# Altium footprint library con-samtec.PCBLIB: 805 footprints (part 38 of 55)
Each footprint in its own frame and in the unit in brackets; x right, y up, seen from the top. Pads: shape width x height; smd on the part's side, far side on the other; paste and mask are expansions set on the pad; w line width, h text height; cw(c..) or ccw(c..) is an arc to the next point about the centre after c.
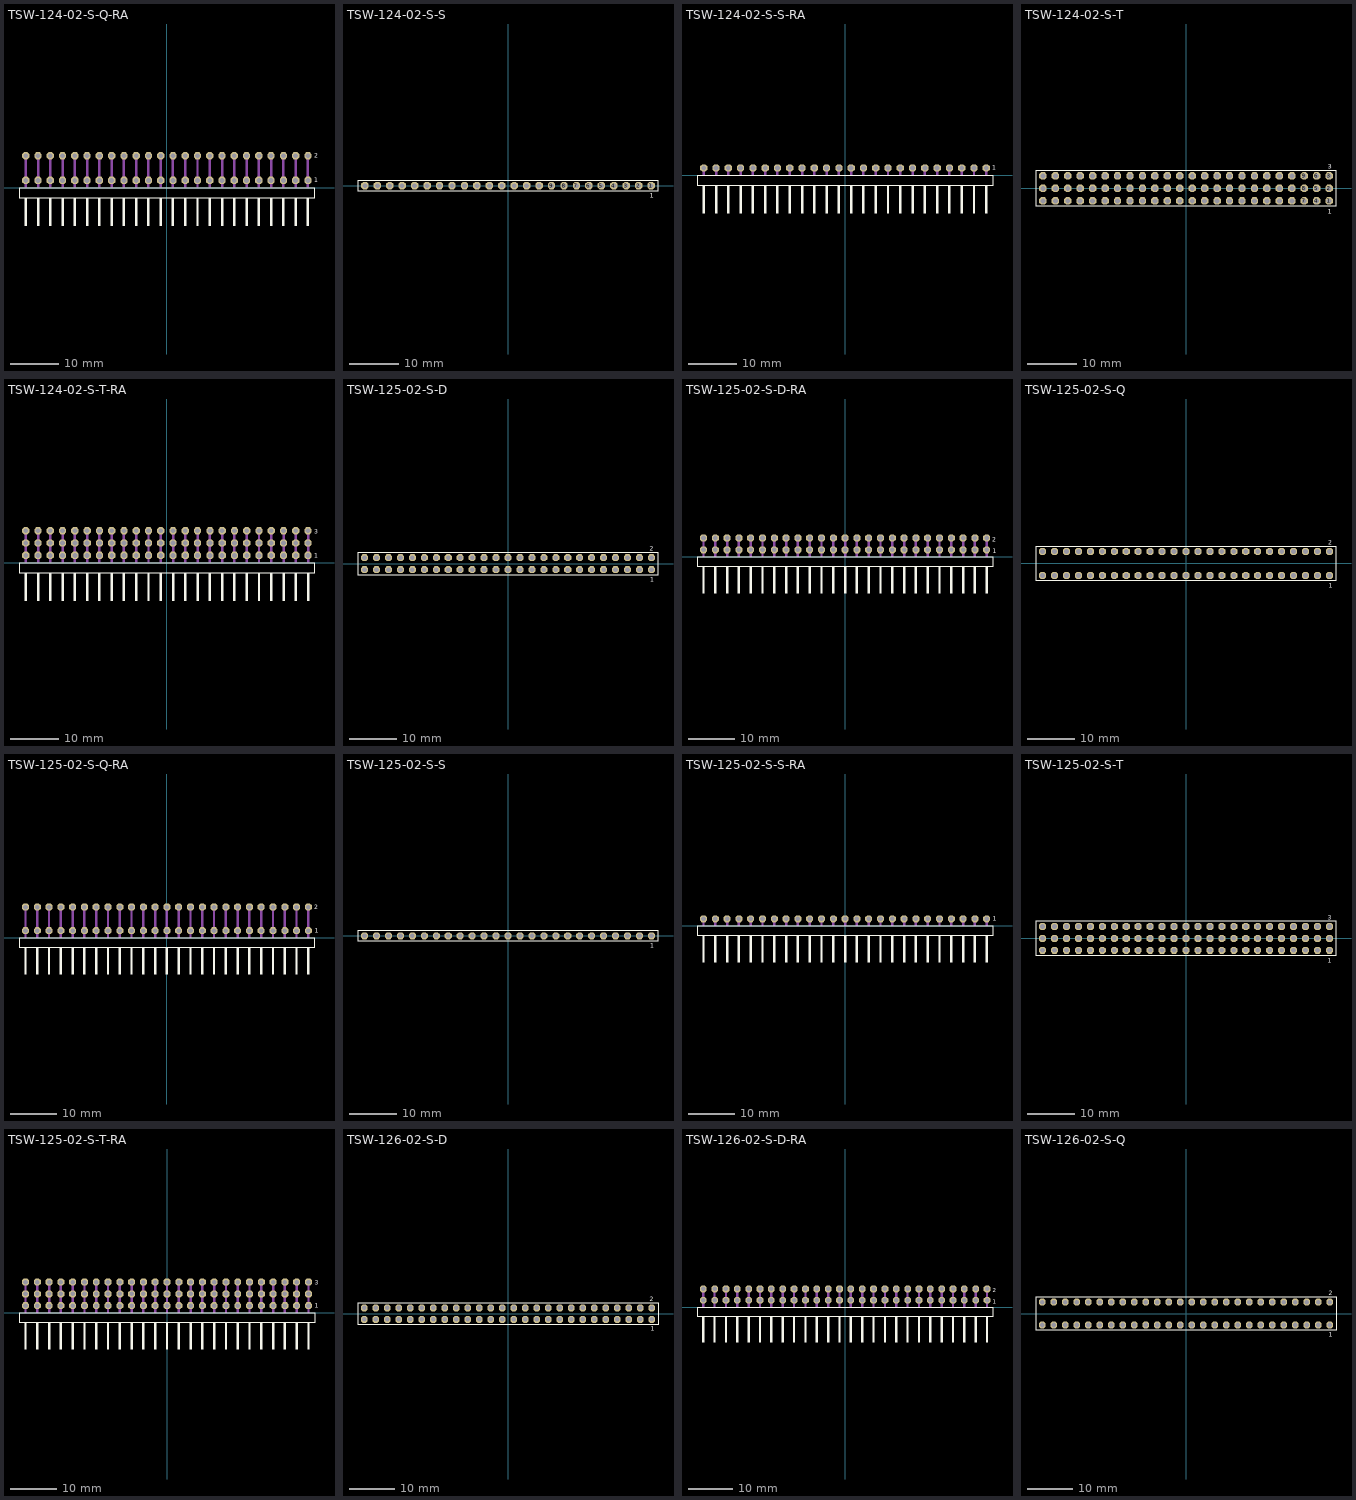
[diagram p37: the footprints below, top view; thin cyan lines are the x and y axes]

## TSW-124-02-S-Q-RA [mil]
pads (48):
  oct 59.06x59.06 hole 39.37: 1(1150,60) 2(1150,260) 3(1050,60) 4(1050,260) 5(950,60) 6(950,260) 7(850,60) 8(850,260) 9(750,60) 10(750,260) 11(650,60) 12(650,260) 13(550,60) 14(550,260) 15(450,60) 16(450,260) 17(350,60) 18(350,260) 19(250,60) 20(250,260) 21(150,60) 22(150,260) 23(50,60) 24(50,260) 25(-50,60) 26(-50,260) 27(-150,60) 28(-150,260) 29(-250,60) 30(-250,260) 31(-350,60) 32(-350,260) 33(-450,60) 34(-450,260) 35(-550,60) 36(-550,260) 37(-650,60) 38(-650,260) 39(-750,60) 40(-750,260) 41(-850,60) 42(-850,260) 43(-950,60) 44(-950,260) 45(-1050,60) 46(-1050,260) 47(-1150,60) 48(-1150,260)
Top Overlay:
  rectangle: -1160,-310.63 -1140,-80.32
  rectangle: -1060,-310.63 -1040,-80.32
  rectangle: -960,-310.63 -940,-80.32
  rectangle: -860,-310.63 -840,-80.32
  rectangle: -760,-310.63 -740,-80.32
  rectangle: -660,-310.63 -640,-80.32
  rectangle: -560,-310.63 -540,-80.32
  rectangle: -460,-310.63 -440,-80.32
  rectangle: -360,-310.63 -340,-80.32
  rectangle: -260,-310.63 -240,-80.32
  rectangle: -160,-310.63 -140,-80.32
  rectangle: -60,-310.63 -40,-80.32
  rectangle: 40,-310.63 60,-80.32
  rectangle: 140,-310.63 160,-80.32
  rectangle: 240,-310.63 260,-80.32
  rectangle: 340,-310.63 360,-80.32
  rectangle: 440,-310.63 460,-80.32
  rectangle: 540,-310.63 560,-80.32
  rectangle: 640,-310.63 660,-80.32
  rectangle: 740,-310.63 760,-80.32
  rectangle: 840,-310.63 860,-80.32
  rectangle: 940,-310.63 960,-80.32
  rectangle: 1040,-310.63 1060,-80.32
  rectangle: 1140,-310.63 1160,-80.32
  lines w8: -1205.08,-80.55 1205.08,-80.55 1205.08,-4.17 -1205.08,-4.17 -1205.08,-80.55
  text "1" at 1203.54,43.31 h36.81
  text "2" at 1201.18,242.72 h36.81
Mechanical 16:
  rectangle: -1160,0 -1140,270
  rectangle: -1060,0 -1040,270
  rectangle: -960,0 -940,270
  rectangle: -860,0 -840,270
  rectangle: -760,0 -740,270
  rectangle: -660,0 -640,270
  rectangle: -560,0 -540,270
  rectangle: -460,0 -440,270
  rectangle: -360,0 -340,270
  rectangle: -260,0 -240,270
  rectangle: -160,0 -140,270
  rectangle: -60,0 -40,270
  rectangle: 40,0 60,270
  rectangle: 140,0 160,270
  rectangle: 240,0 260,270
  rectangle: 340,0 360,270
  rectangle: 440,0 460,270
  rectangle: 540,0 560,270
  rectangle: 640,0 660,270
  rectangle: 740,0 760,270
  rectangle: 840,0 860,270
  rectangle: 940,0 960,270
  rectangle: 1040,0 1060,270
  rectangle: 1140,0 1160,270

## TSW-124-02-S-S [mm]
pads (24):
  oct 1.5x1.5 hole 1: 1(29.21,0) 2(26.67,0) 3(24.13,0) 4(21.59,0) 5(19.05,0) 6(16.51,0) 7(13.97,0) 8(11.43,0) 9(8.89,0) 10(6.35,0) 11(3.81,0) 12(1.27,0) 13(-1.27,0) 14(-3.81,0) 15(-6.35,0) 16(-8.89,0) 17(-11.43,0) 18(-13.97,0) 19(-16.51,0) 20(-19.05,0) 21(-21.59,0) 22(-24.13,0) 23(-26.67,0) 24(-29.21,0)
Top Overlay:
  lines w0.203: -30.609,-1.155 30.609,-1.155 30.609,1.155 -30.609,1.155 -30.609,-1.155
  text "1" at 28.952,-2.498 h0.94
Mechanical 16:
  rectangle: -29.56,-0.35 -28.86,0.35
  rectangle: -27.02,-0.35 -26.32,0.35
  rectangle: -24.48,-0.35 -23.78,0.35
  rectangle: -21.94,-0.35 -21.24,0.35
  rectangle: -19.4,-0.35 -18.7,0.35
  rectangle: -16.86,-0.35 -16.16,0.35
  rectangle: -14.32,-0.35 -13.62,0.35
  rectangle: -11.78,-0.35 -11.08,0.35
  rectangle: -9.24,-0.35 -8.54,0.35
  rectangle: -6.7,-0.35 -6,0.35
  rectangle: -4.16,-0.35 -3.46,0.35
  rectangle: -1.62,-0.35 -0.92,0.35
  rectangle: 0.92,-0.35 1.62,0.35
  rectangle: 3.46,-0.35 4.16,0.35
  rectangle: 6,-0.35 6.7,0.35
  rectangle: 8.54,-0.35 9.24,0.35
  rectangle: 11.08,-0.35 11.78,0.35
  rectangle: 13.62,-0.35 14.32,0.35
  rectangle: 16.16,-0.35 16.86,0.35
  rectangle: 18.7,-0.35 19.4,0.35
  rectangle: 21.24,-0.35 21.94,0.35
  rectangle: 23.78,-0.35 24.48,0.35
  rectangle: 26.32,-0.35 27.02,0.35
  rectangle: 28.86,-0.35 29.56,0.35

## TSW-124-02-S-S-RA [mil]
pads (24):
  oct 59.06x59.06 hole 39.37: 1(1150,60) 2(1050,60) 3(950,60) 4(850,60) 5(750,60) 6(650,60) 7(550,60) 8(450,60) 9(350,60) 10(250,60) 11(150,60) 12(50,60) 13(-50,60) 14(-150,60) 15(-250,60) 16(-350,60) 17(-450,60) 18(-550,60) 19(-650,60) 20(-750,60) 21(-850,60) 22(-950,60) 23(-1050,60) 24(-1150,60)
Top Overlay:
  rectangle: -1160,-310.63 -1140,-80.32
  rectangle: -1060,-310.63 -1040,-80.32
  rectangle: -960,-310.63 -940,-80.32
  rectangle: -860,-310.63 -840,-80.32
  rectangle: -760,-310.63 -740,-80.32
  rectangle: -660,-310.63 -640,-80.32
  rectangle: -560,-310.63 -540,-80.32
  rectangle: -460,-310.63 -440,-80.32
  rectangle: -360,-310.63 -340,-80.32
  rectangle: -260,-310.63 -240,-80.32
  rectangle: -160,-310.63 -140,-80.32
  rectangle: -60,-310.63 -40,-80.32
  rectangle: 40,-310.63 60,-80.32
  rectangle: 140,-310.63 160,-80.32
  rectangle: 240,-310.63 260,-80.32
  rectangle: 340,-310.63 360,-80.32
  rectangle: 440,-310.63 460,-80.32
  rectangle: 540,-310.63 560,-80.32
  rectangle: 640,-310.63 660,-80.32
  rectangle: 740,-310.63 760,-80.32
  rectangle: 840,-310.63 860,-80.32
  rectangle: 940,-310.63 960,-80.32
  rectangle: 1040,-310.63 1060,-80.32
  rectangle: 1140,-310.63 1160,-80.32
  lines w8: -1205.08,-80.55 1205.08,-80.55 1205.08,-4.17 -1205.08,-4.17 -1205.08,-80.55
  text "1" at 1200.47,45.35 h36.81
Mechanical 16:
  rectangle: -1160,0 -1140,70
  rectangle: -1060,0 -1040,70
  rectangle: -960,0 -940,70
  rectangle: -860,0 -840,70
  rectangle: -760,0 -740,70
  rectangle: -660,0 -640,70
  rectangle: -560,0 -540,70
  rectangle: -460,0 -440,70
  rectangle: -360,0 -340,70
  rectangle: -260,0 -240,70
  rectangle: -160,0 -140,70
  rectangle: -60,0 -40,70
  rectangle: 40,0 60,70
  rectangle: 140,0 160,70
  rectangle: 240,0 260,70
  rectangle: 340,0 360,70
  rectangle: 440,0 460,70
  rectangle: 540,0 560,70
  rectangle: 640,0 660,70
  rectangle: 740,0 760,70
  rectangle: 840,0 860,70
  rectangle: 940,0 960,70
  rectangle: 1040,0 1060,70
  rectangle: 1140,0 1160,70

## TSW-124-02-S-T [mm]
pads (72):
  oct 1.5x1.5 hole 1: 1(29.21,-2.54) 2(29.21,0) 3(29.21,2.54) 4(26.67,-2.54) 5(26.67,0) 6(26.67,2.54) 7(24.13,-2.54) 8(24.13,0) 9(24.13,2.54) 10(21.59,-2.54) 11(21.59,0) 12(21.59,2.54) 13(19.05,-2.54) 14(19.05,0) 15(19.05,2.54) 16(16.51,-2.54) 17(16.51,0) 18(16.51,2.54) 19(13.97,-2.54) 20(13.97,0) 21(13.97,2.54) 22(11.43,-2.54) 23(11.43,0) 24(11.43,2.54) 25(8.89,-2.54) 26(8.89,0) 27(8.89,2.54) 28(6.35,-2.54) 29(6.35,0) 30(6.35,2.54) 31(3.81,-2.54) 32(3.81,0) 33(3.81,2.54) 34(1.27,-2.54) 35(1.27,0) 36(1.27,2.54) 37(-1.27,-2.54) 38(-1.27,0) 39(-1.27,2.54) 40(-3.81,-2.54) 41(-3.81,0) 42(-3.81,2.54) 43(-6.35,-2.54) 44(-6.35,0) 45(-6.35,2.54) 46(-8.89,-2.54) 47(-8.89,0) 48(-8.89,2.54) 49(-11.43,-2.54) 50(-11.43,0) 51(-11.43,2.54) 52(-13.97,-2.54) 53(-13.97,0) 54(-13.97,2.54) 55(-16.51,-2.54) 56(-16.51,0) 57(-16.51,2.54) 58(-19.05,-2.54) 59(-19.05,0) 60(-19.05,2.54) 61(-21.59,-2.54) 62(-21.59,0) 63(-21.59,2.54) 64(-24.13,-2.54) 65(-24.13,0) 66(-24.13,2.54) 67(-26.67,-2.54) 68(-26.67,0) 69(-26.67,2.54) 70(-29.21,-2.54) 71(-29.21,0) 72(-29.21,2.54)
Top Overlay:
  lines w0.203: -30.609,-3.695 30.609,-3.695 30.609,3.695 -30.609,3.695 -30.609,-3.695
  text "1" at 28.902,-5.188 h0.94
  text "3" at 28.898,3.989 h0.94
Mechanical 16:
  rectangle: -29.56,-2.89 -28.86,-2.19
  rectangle: -29.56,-0.35 -28.86,0.35
  rectangle: -29.56,2.19 -28.86,2.89
  rectangle: -27.02,-2.89 -26.32,-2.19
  rectangle: -27.02,-0.35 -26.32,0.35
  rectangle: -27.02,2.19 -26.32,2.89
  rectangle: -24.48,-2.89 -23.78,-2.19
  rectangle: -24.48,-0.35 -23.78,0.35
  rectangle: -24.48,2.19 -23.78,2.89
  rectangle: -21.94,-2.89 -21.24,-2.19
  rectangle: -21.94,-0.35 -21.24,0.35
  rectangle: -21.94,2.19 -21.24,2.89
  rectangle: -19.4,-2.89 -18.7,-2.19
  rectangle: -19.4,-0.35 -18.7,0.35
  rectangle: -19.4,2.19 -18.7,2.89
  rectangle: -16.86,-2.89 -16.16,-2.19
  rectangle: -16.86,-0.35 -16.16,0.35
  rectangle: -16.86,2.19 -16.16,2.89
  rectangle: -14.32,-2.89 -13.62,-2.19
  rectangle: -14.32,-0.35 -13.62,0.35
  rectangle: -14.32,2.19 -13.62,2.89
  rectangle: -11.78,-2.89 -11.08,-2.19
  rectangle: -11.78,-0.35 -11.08,0.35
  rectangle: -11.78,2.19 -11.08,2.89
  rectangle: -9.24,-2.89 -8.54,-2.19
  rectangle: -9.24,-0.35 -8.54,0.35
  rectangle: -9.24,2.19 -8.54,2.89
  rectangle: -6.7,-2.89 -6,-2.19
  rectangle: -6.7,-0.35 -6,0.35
  rectangle: -6.7,2.19 -6,2.89
  rectangle: -4.16,-2.89 -3.46,-2.19
  rectangle: -4.16,-0.35 -3.46,0.35
  rectangle: -4.16,2.19 -3.46,2.89
  rectangle: -1.62,-2.89 -0.92,-2.19
  rectangle: -1.62,-0.35 -0.92,0.35
  rectangle: -1.62,2.19 -0.92,2.89
  rectangle: 0.92,-2.89 1.62,-2.19
  rectangle: 0.92,-0.35 1.62,0.35
  rectangle: 0.92,2.19 1.62,2.89
  rectangle: 3.46,-2.89 4.16,-2.19
  rectangle: 3.46,-0.35 4.16,0.35
  rectangle: 3.46,2.19 4.16,2.89
  rectangle: 6,-2.89 6.7,-2.19
  rectangle: 6,-0.35 6.7,0.35
  rectangle: 6,2.19 6.7,2.89
  rectangle: 8.54,-2.89 9.24,-2.19
  rectangle: 8.54,-0.35 9.24,0.35
  rectangle: 8.54,2.19 9.24,2.89
  rectangle: 11.08,-2.89 11.78,-2.19
  rectangle: 11.08,-0.35 11.78,0.35
  rectangle: 11.08,2.19 11.78,2.89
  rectangle: 13.62,-2.89 14.32,-2.19
  rectangle: 13.62,-0.35 14.32,0.35
  rectangle: 13.62,2.19 14.32,2.89
  rectangle: 16.16,-2.89 16.86,-2.19
  rectangle: 16.16,-0.35 16.86,0.35
  rectangle: 16.16,2.19 16.86,2.89
  rectangle: 18.7,-2.89 19.4,-2.19
  rectangle: 18.7,-0.35 19.4,0.35
  rectangle: 18.7,2.19 19.4,2.89
  rectangle: 21.24,-2.89 21.94,-2.19
  rectangle: 21.24,-0.35 21.94,0.35
  rectangle: 21.24,2.19 21.94,2.89
  rectangle: 23.78,-2.89 24.48,-2.19
  rectangle: 23.78,-0.35 24.48,0.35
  rectangle: 23.78,2.19 24.48,2.89
  rectangle: 26.32,-2.89 27.02,-2.19
  rectangle: 26.32,-0.35 27.02,0.35
  rectangle: 26.32,2.19 27.02,2.89
  rectangle: 28.86,-2.89 29.56,-2.19
  rectangle: 28.86,-0.35 29.56,0.35
  rectangle: 28.86,2.19 29.56,2.89

## TSW-124-02-S-T-RA [mil]
pads (72):
  oct 59.06x59.06 hole 39.37: 1(1150,60) 2(1150,160) 3(1150,260) 4(1050,60) 5(1050,160) 6(1050,260) 7(950,60) 8(950,160) 9(950,260) 10(850,60) 11(850,160) 12(850,260) 13(750,60) 14(750,160) 15(750,260) 16(650,60) 17(650,160) 18(650,260) 19(550,60) 20(550,160) 21(550,260) 22(450,60) 23(450,160) 24(450,260) 25(350,60) 26(350,160) 27(350,260) 28(250,60) 29(250,160) 30(250,260) 31(150,60) 32(150,160) 33(150,260) 34(50,60) 35(50,160) 36(50,260) 37(-50,60) 38(-50,160) 39(-50,260) 40(-150,60) 41(-150,160) 42(-150,260) 43(-250,60) 44(-250,160) 45(-250,260) 46(-350,60) 47(-350,160) 48(-350,260) 49(-450,60) 50(-450,160) 51(-450,260) 52(-550,60) 53(-550,160) 54(-550,260) 55(-650,60) 56(-650,160) 57(-650,260) 58(-750,60) 59(-750,160) 60(-750,260) 61(-850,60) 62(-850,160) 63(-850,260) 64(-950,60) 65(-950,160) 66(-950,260) 67(-1050,60) 68(-1050,160) 69(-1050,260) 70(-1150,60) 71(-1150,160) 72(-1150,260)
Top Overlay:
  rectangle: -1160,-310.63 -1140,-80.32
  rectangle: -1060,-310.63 -1040,-80.32
  rectangle: -960,-310.63 -940,-80.32
  rectangle: -860,-310.63 -840,-80.32
  rectangle: -760,-310.63 -740,-80.32
  rectangle: -660,-310.63 -640,-80.32
  rectangle: -560,-310.63 -540,-80.32
  rectangle: -460,-310.63 -440,-80.32
  rectangle: -360,-310.63 -340,-80.32
  rectangle: -260,-310.63 -240,-80.32
  rectangle: -160,-310.63 -140,-80.32
  rectangle: -60,-310.63 -40,-80.32
  rectangle: 40,-310.63 60,-80.32
  rectangle: 140,-310.63 160,-80.32
  rectangle: 240,-310.63 260,-80.32
  rectangle: 340,-310.63 360,-80.32
  rectangle: 440,-310.63 460,-80.32
  rectangle: 540,-310.63 560,-80.32
  rectangle: 640,-310.63 660,-80.32
  rectangle: 740,-310.63 760,-80.32
  rectangle: 840,-310.63 860,-80.32
  rectangle: 940,-310.63 960,-80.32
  rectangle: 1040,-310.63 1060,-80.32
  rectangle: 1140,-310.63 1160,-80.32
  lines w8: -1205.08,-80.55 1205.08,-80.55 1205.08,-4.17 -1205.08,-4.17 -1205.08,-80.55
  text "1" at 1201.57,41.34 h36.81
  text "3" at 1202.17,236.81 h36.81
Mechanical 16:
  rectangle: -1160,0 -1140,270
  rectangle: -1060,0 -1040,270
  rectangle: -960,0 -940,270
  rectangle: -860,0 -840,270
  rectangle: -760,0 -740,270
  rectangle: -660,0 -640,270
  rectangle: -560,0 -540,270
  rectangle: -460,0 -440,270
  rectangle: -360,0 -340,270
  rectangle: -260,0 -240,270
  rectangle: -160,0 -140,270
  rectangle: -60,0 -40,270
  rectangle: 40,0 60,270
  rectangle: 140,0 160,270
  rectangle: 240,0 260,270
  rectangle: 340,0 360,270
  rectangle: 440,0 460,270
  rectangle: 540,0 560,270
  rectangle: 640,0 660,270
  rectangle: 740,0 760,270
  rectangle: 840,0 860,270
  rectangle: 940,0 960,270
  rectangle: 1040,0 1060,270
  rectangle: 1140,0 1160,270

## TSW-125-02-S-D [mm]
pads (50):
  oct 1.5x1.5 hole 1: 1(30.48,-1.27) 2(30.48,1.27) 3(27.94,-1.27) 4(27.94,1.27) 5(25.4,-1.27) 6(25.4,1.27) 7(22.86,-1.27) 8(22.86,1.27) 9(20.32,-1.27) 10(20.32,1.27) 11(17.78,-1.27) 12(17.78,1.27) 13(15.24,-1.27) 14(15.24,1.27) 15(12.7,-1.27) 16(12.7,1.27) 17(10.16,-1.27) 18(10.16,1.27) 19(7.62,-1.27) 20(7.62,1.27) 21(5.08,-1.27) 22(5.08,1.27) 23(2.54,-1.27) 24(2.54,1.27) 25(0,-1.27) 26(0,1.27) 27(-2.54,-1.27) 28(-2.54,1.27) 29(-5.08,-1.27) 30(-5.08,1.27) 31(-7.62,-1.27) 32(-7.62,1.27) 33(-10.16,-1.27) 34(-10.16,1.27) 35(-12.7,-1.27) 36(-12.7,1.27) 37(-15.24,-1.27) 38(-15.24,1.27) 39(-17.78,-1.27) 40(-17.78,1.27) 41(-20.32,-1.27) 42(-20.32,1.27) 43(-22.86,-1.27) 44(-22.86,1.27) 45(-25.4,-1.27) 46(-25.4,1.27) 47(-27.94,-1.27) 48(-27.94,1.27) 49(-30.48,-1.27) 50(-30.48,1.27)
Top Overlay:
  lines w0.203: -31.879,-2.425 31.879,-2.425 31.879,2.425 -31.879,2.425 -31.879,-2.425
  text "1" at 30.272,-3.818 h0.94
  text "2" at 30.097,2.744 h0.94
Mechanical 16:
  rectangle: -30.83,-1.62 -30.13,-0.92
  rectangle: -30.83,0.92 -30.13,1.62
  rectangle: -28.29,-1.62 -27.59,-0.92
  rectangle: -28.29,0.92 -27.59,1.62
  rectangle: -25.75,-1.62 -25.05,-0.92
  rectangle: -25.75,0.92 -25.05,1.62
  rectangle: -23.21,-1.62 -22.51,-0.92
  rectangle: -23.21,0.92 -22.51,1.62
  rectangle: -20.67,-1.62 -19.97,-0.92
  rectangle: -20.67,0.92 -19.97,1.62
  rectangle: -18.13,-1.62 -17.43,-0.92
  rectangle: -18.13,0.92 -17.43,1.62
  rectangle: -15.59,-1.62 -14.89,-0.92
  rectangle: -15.59,0.92 -14.89,1.62
  rectangle: -13.05,-1.62 -12.35,-0.92
  rectangle: -13.05,0.92 -12.35,1.62
  rectangle: -10.51,-1.62 -9.81,-0.92
  rectangle: -10.51,0.92 -9.81,1.62
  rectangle: -7.97,-1.62 -7.27,-0.92
  rectangle: -7.97,0.92 -7.27,1.62
  rectangle: -5.43,-1.62 -4.73,-0.92
  rectangle: -5.43,0.92 -4.73,1.62
  rectangle: -2.89,-1.62 -2.19,-0.92
  rectangle: -2.89,0.92 -2.19,1.62
  rectangle: -0.35,-1.62 0.35,-0.92
  rectangle: -0.35,0.92 0.35,1.62
  rectangle: 2.19,-1.62 2.89,-0.92
  rectangle: 2.19,0.92 2.89,1.62
  rectangle: 4.73,-1.62 5.43,-0.92
  rectangle: 4.73,0.92 5.43,1.62
  rectangle: 7.27,-1.62 7.97,-0.92
  rectangle: 7.27,0.92 7.97,1.62
  rectangle: 9.81,-1.62 10.51,-0.92
  rectangle: 9.81,0.92 10.51,1.62
  rectangle: 12.35,-1.62 13.05,-0.92
  rectangle: 12.35,0.92 13.05,1.62
  rectangle: 14.89,-1.62 15.59,-0.92
  rectangle: 14.89,0.92 15.59,1.62
  rectangle: 17.43,-1.62 18.13,-0.92
  rectangle: 17.43,0.92 18.13,1.62
  rectangle: 19.97,-1.62 20.67,-0.92
  rectangle: 19.97,0.92 20.67,1.62
  rectangle: 22.51,-1.62 23.21,-0.92
  rectangle: 22.51,0.92 23.21,1.62
  rectangle: 25.05,-1.62 25.75,-0.92
  rectangle: 25.05,0.92 25.75,1.62
  rectangle: 27.59,-1.62 28.29,-0.92
  rectangle: 27.59,0.92 28.29,1.62
  rectangle: 30.13,-1.62 30.83,-0.92
  rectangle: 30.13,0.92 30.83,1.62

## TSW-125-02-S-D-RA [mil]
pads (50):
  oct 59.06x59.06 hole 39.37: 1(1200,60) 2(1200,160) 3(1100,60) 4(1100,160) 5(1000,60) 6(1000,160) 7(900,60) 8(900,160) 9(800,60) 10(800,160) 11(700,60) 12(700,160) 13(600,60) 14(600,160) 15(500,60) 16(500,160) 17(400,60) 18(400,160) 19(300,60) 20(300,160) 21(200,60) 22(200,160) 23(100,60) 24(100,160) 25(0,60) 26(0,160) 27(-100,60) 28(-100,160) 29(-200,60) 30(-200,160) 31(-300,60) 32(-300,160) 33(-400,60) 34(-400,160) 35(-500,60) 36(-500,160) 37(-600,60) 38(-600,160) 39(-700,60) 40(-700,160) 41(-800,60) 42(-800,160) 43(-900,60) 44(-900,160) 45(-1000,60) 46(-1000,160) 47(-1100,60) 48(-1100,160) 49(-1200,60) 50(-1200,160)
Top Overlay:
  rectangle: -1210,-310.63 -1190,-80.32
  rectangle: -1110,-310.63 -1090,-80.32
  rectangle: -1010,-310.63 -990,-80.32
  rectangle: -910,-310.63 -890,-80.32
  rectangle: -810,-310.63 -790,-80.32
  rectangle: -710,-310.63 -690,-80.32
  rectangle: -610,-310.63 -590,-80.32
  rectangle: -510,-310.63 -490,-80.32
  rectangle: -410,-310.63 -390,-80.32
  rectangle: -310,-310.63 -290,-80.32
  rectangle: -210,-310.63 -190,-80.32
  rectangle: -110,-310.63 -90,-80.32
  rectangle: -10,-310.63 10,-80.32
  rectangle: 90,-310.63 110,-80.32
  rectangle: 190,-310.63 210,-80.32
  rectangle: 290,-310.63 310,-80.32
  rectangle: 390,-310.63 410,-80.32
  rectangle: 490,-310.63 510,-80.32
  rectangle: 590,-310.63 610,-80.32
  rectangle: 690,-310.63 710,-80.32
  rectangle: 790,-310.63 810,-80.32
  rectangle: 890,-310.63 910,-80.32
  rectangle: 990,-310.63 1010,-80.32
  rectangle: 1090,-310.63 1110,-80.32
  rectangle: 1190,-310.63 1210,-80.32
  lines w8: -1255.08,-80.55 1255.08,-80.55 1255.08,-4.17 -1255.08,-4.17 -1255.08,-80.55
  text "1" at 1250.59,30.51 h36.81
  text "2" at 1249.21,129.53 h36.81
Mechanical 16:
  rectangle: -1210,0 -1190,170
  rectangle: -1110,0 -1090,170
  rectangle: -1010,0 -990,170
  rectangle: -910,0 -890,170
  rectangle: -810,0 -790,170
  rectangle: -710,0 -690,170
  rectangle: -610,0 -590,170
  rectangle: -510,0 -490,170
  rectangle: -410,0 -390,170
  rectangle: -310,0 -290,170
  rectangle: -210,0 -190,170
  rectangle: -110,0 -90,170
  rectangle: -10,0 10,170
  rectangle: 90,0 110,170
  rectangle: 190,0 210,170
  rectangle: 290,0 310,170
  rectangle: 390,0 410,170
  rectangle: 490,0 510,170
  rectangle: 590,0 610,170
  rectangle: 690,0 710,170
  rectangle: 790,0 810,170
  rectangle: 890,0 910,170
  rectangle: 990,0 1010,170
  rectangle: 1090,0 1110,170
  rectangle: 1190,0 1210,170

## TSW-125-02-S-Q [mm]
pads (50):
  oct 1.5x1.5 hole 1: 1(30.48,-2.54) 2(30.48,2.54) 3(27.94,-2.54) 4(27.94,2.54) 5(25.4,-2.54) 6(25.4,2.54) 7(22.86,-2.54) 8(22.86,2.54) 9(20.32,-2.54) 10(20.32,2.54) 11(17.78,-2.54) 12(17.78,2.54) 13(15.24,-2.54) 14(15.24,2.54) 15(12.7,-2.54) 16(12.7,2.54) 17(10.16,-2.54) 18(10.16,2.54) 19(7.62,-2.54) 20(7.62,2.54) 21(5.08,-2.54) 22(5.08,2.54) 23(2.54,-2.54) 24(2.54,2.54) 25(0,-2.54) 26(0,2.54) 27(-2.54,-2.54) 28(-2.54,2.54) 29(-5.08,-2.54) 30(-5.08,2.54) 31(-7.62,-2.54) 32(-7.62,2.54) 33(-10.16,-2.54) 34(-10.16,2.54) 35(-12.7,-2.54) 36(-12.7,2.54) 37(-15.24,-2.54) 38(-15.24,2.54) 39(-17.78,-2.54) 40(-17.78,2.54) 41(-20.32,-2.54) 42(-20.32,2.54) 43(-22.86,-2.54) 44(-22.86,2.54) 45(-25.4,-2.54) 46(-25.4,2.54) 47(-27.94,-2.54) 48(-27.94,2.54) 49(-30.48,-2.54) 50(-30.48,2.54)
Top Overlay:
  lines w0.203: -31.879,-3.695 31.879,-3.695 31.879,3.695 -31.879,3.695 -31.879,-3.695
  text "1" at 30.322,-5.138 h0.94
  text "2" at 30.222,3.989 h0.94
Mechanical 16:
  rectangle: -30.83,-2.89 -30.13,-2.19
  rectangle: -30.83,2.19 -30.13,2.89
  rectangle: -28.29,-2.89 -27.59,-2.19
  rectangle: -28.29,2.19 -27.59,2.89
  rectangle: -25.75,-2.89 -25.05,-2.19
  rectangle: -25.75,2.19 -25.05,2.89
  rectangle: -23.21,-2.89 -22.51,-2.19
  rectangle: -23.21,2.19 -22.51,2.89
  rectangle: -20.67,-2.89 -19.97,-2.19
  rectangle: -20.67,2.19 -19.97,2.89
  rectangle: -18.13,-2.89 -17.43,-2.19
  rectangle: -18.13,2.19 -17.43,2.89
  rectangle: -15.59,-2.89 -14.89,-2.19
  rectangle: -15.59,2.19 -14.89,2.89
  rectangle: -13.05,-2.89 -12.35,-2.19
  rectangle: -13.05,2.19 -12.35,2.89
  rectangle: -10.51,-2.89 -9.81,-2.19
  rectangle: -10.51,2.19 -9.81,2.89
  rectangle: -7.97,-2.89 -7.27,-2.19
  rectangle: -7.97,2.19 -7.27,2.89
  rectangle: -5.43,-2.89 -4.73,-2.19
  rectangle: -5.43,2.19 -4.73,2.89
  rectangle: -2.89,-2.89 -2.19,-2.19
  rectangle: -2.89,2.19 -2.19,2.89
  rectangle: -0.35,-2.89 0.35,-2.19
  rectangle: -0.35,2.19 0.35,2.89
  rectangle: 2.19,-2.89 2.89,-2.19
  rectangle: 2.19,2.19 2.89,2.89
  rectangle: 4.73,-2.89 5.43,-2.19
  rectangle: 4.73,2.19 5.43,2.89
  rectangle: 7.27,-2.89 7.97,-2.19
  rectangle: 7.27,2.19 7.97,2.89
  rectangle: 9.81,-2.89 10.51,-2.19
  rectangle: 9.81,2.19 10.51,2.89
  rectangle: 12.35,-2.89 13.05,-2.19
  rectangle: 12.35,2.19 13.05,2.89
  rectangle: 14.89,-2.89 15.59,-2.19
  rectangle: 14.89,2.19 15.59,2.89
  rectangle: 17.43,-2.89 18.13,-2.19
  rectangle: 17.43,2.19 18.13,2.89
  rectangle: 19.97,-2.89 20.67,-2.19
  rectangle: 19.97,2.19 20.67,2.89
  rectangle: 22.51,-2.89 23.21,-2.19
  rectangle: 22.51,2.19 23.21,2.89
  rectangle: 25.05,-2.89 25.75,-2.19
  rectangle: 25.05,2.19 25.75,2.89
  rectangle: 27.59,-2.89 28.29,-2.19
  rectangle: 27.59,2.19 28.29,2.89
  rectangle: 30.13,-2.89 30.83,-2.19
  rectangle: 30.13,2.19 30.83,2.89

## TSW-125-02-S-Q-RA [mil]
pads (50):
  oct 59.06x59.06 hole 39.37: 1(1200,60) 2(1200,260) 3(1100,60) 4(1100,260) 5(1000,60) 6(1000,260) 7(900,60) 8(900,260) 9(800,60) 10(800,260) 11(700,60) 12(700,260) 13(600,60) 14(600,260) 15(500,60) 16(500,260) 17(400,60) 18(400,260) 19(300,60) 20(300,260) 21(200,60) 22(200,260) 23(100,60) 24(100,260) 25(0,60) 26(0,260) 27(-100,60) 28(-100,260) 29(-200,60) 30(-200,260) 31(-300,60) 32(-300,260) 33(-400,60) 34(-400,260) 35(-500,60) 36(-500,260) 37(-600,60) 38(-600,260) 39(-700,60) 40(-700,260) 41(-800,60) 42(-800,260) 43(-900,60) 44(-900,260) 45(-1000,60) 46(-1000,260) 47(-1100,60) 48(-1100,260) 49(-1200,60) 50(-1200,260)
Top Overlay:
  rectangle: -1210,-310.63 -1190,-80.32
  rectangle: -1110,-310.63 -1090,-80.32
  rectangle: -1010,-310.63 -990,-80.32
  rectangle: -910,-310.63 -890,-80.32
  rectangle: -810,-310.63 -790,-80.32
  rectangle: -710,-310.63 -690,-80.32
  rectangle: -610,-310.63 -590,-80.32
  rectangle: -510,-310.63 -490,-80.32
  rectangle: -410,-310.63 -390,-80.32
  rectangle: -310,-310.63 -290,-80.32
  rectangle: -210,-310.63 -190,-80.32
  rectangle: -110,-310.63 -90,-80.32
  rectangle: -10,-310.63 10,-80.32
  rectangle: 90,-310.63 110,-80.32
  rectangle: 190,-310.63 210,-80.32
  rectangle: 290,-310.63 310,-80.32
  rectangle: 390,-310.63 410,-80.32
  rectangle: 490,-310.63 510,-80.32
  rectangle: 590,-310.63 610,-80.32
  rectangle: 690,-310.63 710,-80.32
  rectangle: 790,-310.63 810,-80.32
  rectangle: 890,-310.63 910,-80.32
  rectangle: 990,-310.63 1010,-80.32
  rectangle: 1090,-310.63 1110,-80.32
  rectangle: 1190,-310.63 1210,-80.32
  lines w8: -1255.08,-80.55 1255.08,-80.55 1255.08,-4.17 -1255.08,-4.17 -1255.08,-80.55
  text "1" at 1253.54,43.31 h36.81
  text "2" at 1251.18,242.72 h36.81
Mechanical 16:
  rectangle: -1210,0 -1190,270
  rectangle: -1110,0 -1090,270
  rectangle: -1010,0 -990,270
  rectangle: -910,0 -890,270
  rectangle: -810,0 -790,270
  rectangle: -710,0 -690,270
  rectangle: -610,0 -590,270
  rectangle: -510,0 -490,270
  rectangle: -410,0 -390,270
  rectangle: -310,0 -290,270
  rectangle: -210,0 -190,270
  rectangle: -110,0 -90,270
  rectangle: -10,0 10,270
  rectangle: 90,0 110,270
  rectangle: 190,0 210,270
  rectangle: 290,0 310,270
  rectangle: 390,0 410,270
  rectangle: 490,0 510,270
  rectangle: 590,0 610,270
  rectangle: 690,0 710,270
  rectangle: 790,0 810,270
  rectangle: 890,0 910,270
  rectangle: 990,0 1010,270
  rectangle: 1090,0 1110,270
  rectangle: 1190,0 1210,270

## TSW-125-02-S-S [mm]
pads (25):
  oct 1.5x1.5 hole 1: 1(30.48,0) 2(27.94,0) 3(25.4,0) 4(22.86,0) 5(20.32,0) 6(17.78,0) 7(15.24,0) 8(12.7,0) 9(10.16,0) 10(7.62,0) 11(5.08,0) 12(2.54,0) 13(0,0) 14(-2.54,0) 15(-5.08,0) 16(-7.62,0) 17(-10.16,0) 18(-12.7,0) 19(-15.24,0) 20(-17.78,0) 21(-20.32,0) 22(-22.86,0) 23(-25.4,0) 24(-27.94,0) 25(-30.48,0)
Top Overlay:
  lines w0.203: -31.879,-1.155 31.879,-1.155 31.879,1.155 -31.879,1.155 -31.879,-1.155
  text "1" at 30.222,-2.498 h0.94
Mechanical 16:
  rectangle: -30.83,-0.35 -30.13,0.35
  rectangle: -28.29,-0.35 -27.59,0.35
  rectangle: -25.75,-0.35 -25.05,0.35
  rectangle: -23.21,-0.35 -22.51,0.35
  rectangle: -20.67,-0.35 -19.97,0.35
  rectangle: -18.13,-0.35 -17.43,0.35
  rectangle: -15.59,-0.35 -14.89,0.35
  rectangle: -13.05,-0.35 -12.35,0.35
  rectangle: -10.51,-0.35 -9.81,0.35
  rectangle: -7.97,-0.35 -7.27,0.35
  rectangle: -5.43,-0.35 -4.73,0.35
  rectangle: -2.89,-0.35 -2.19,0.35
  rectangle: -0.35,-0.35 0.35,0.35
  rectangle: 2.19,-0.35 2.89,0.35
  rectangle: 4.73,-0.35 5.43,0.35
  rectangle: 7.27,-0.35 7.97,0.35
  rectangle: 9.81,-0.35 10.51,0.35
  rectangle: 12.35,-0.35 13.05,0.35
  rectangle: 14.89,-0.35 15.59,0.35
  rectangle: 17.43,-0.35 18.13,0.35
  rectangle: 19.97,-0.35 20.67,0.35
  rectangle: 22.51,-0.35 23.21,0.35
  rectangle: 25.05,-0.35 25.75,0.35
  rectangle: 27.59,-0.35 28.29,0.35
  rectangle: 30.13,-0.35 30.83,0.35

## TSW-125-02-S-S-RA [mil]
pads (25):
  oct 59.06x59.06 hole 39.37: 1(1200,60) 2(1100,60) 3(1000,60) 4(900,60) 5(800,60) 6(700,60) 7(600,60) 8(500,60) 9(400,60) 10(300,60) 11(200,60) 12(100,60) 13(0,60) 14(-100,60) 15(-200,60) 16(-300,60) 17(-400,60) 18(-500,60) 19(-600,60) 20(-700,60) 21(-800,60) 22(-900,60) 23(-1000,60) 24(-1100,60) 25(-1200,60)
Top Overlay:
  rectangle: -1210,-310.63 -1190,-80.32
  rectangle: -1110,-310.63 -1090,-80.32
  rectangle: -1010,-310.63 -990,-80.32
  rectangle: -910,-310.63 -890,-80.32
  rectangle: -810,-310.63 -790,-80.32
  rectangle: -710,-310.63 -690,-80.32
  rectangle: -610,-310.63 -590,-80.32
  rectangle: -510,-310.63 -490,-80.32
  rectangle: -410,-310.63 -390,-80.32
  rectangle: -310,-310.63 -290,-80.32
  rectangle: -210,-310.63 -190,-80.32
  rectangle: -110,-310.63 -90,-80.32
  rectangle: -10,-310.63 10,-80.32
  rectangle: 90,-310.63 110,-80.32
  rectangle: 190,-310.63 210,-80.32
  rectangle: 290,-310.63 310,-80.32
  rectangle: 390,-310.63 410,-80.32
  rectangle: 490,-310.63 510,-80.32
  rectangle: 590,-310.63 610,-80.32
  rectangle: 690,-310.63 710,-80.32
  rectangle: 790,-310.63 810,-80.32
  rectangle: 890,-310.63 910,-80.32
  rectangle: 990,-310.63 1010,-80.32
  rectangle: 1090,-310.63 1110,-80.32
  rectangle: 1190,-310.63 1210,-80.32
  lines w8: -1255.08,-80.55 1255.08,-80.55 1255.08,-4.17 -1255.08,-4.17 -1255.08,-80.55
  text "1" at 1250.47,45.35 h36.81
Mechanical 16:
  rectangle: -1210,0 -1190,70
  rectangle: -1110,0 -1090,70
  rectangle: -1010,0 -990,70
  rectangle: -910,0 -890,70
  rectangle: -810,0 -790,70
  rectangle: -710,0 -690,70
  rectangle: -610,0 -590,70
  rectangle: -510,0 -490,70
  rectangle: -410,0 -390,70
  rectangle: -310,0 -290,70
  rectangle: -210,0 -190,70
  rectangle: -110,0 -90,70
  rectangle: -10,0 10,70
  rectangle: 90,0 110,70
  rectangle: 190,0 210,70
  rectangle: 290,0 310,70
  rectangle: 390,0 410,70
  rectangle: 490,0 510,70
  rectangle: 590,0 610,70
  rectangle: 690,0 710,70
  rectangle: 790,0 810,70
  rectangle: 890,0 910,70
  rectangle: 990,0 1010,70
  rectangle: 1090,0 1110,70
  rectangle: 1190,0 1210,70

## TSW-125-02-S-T [mm]
pads (75):
  oct 1.5x1.5 hole 1: 1(30.48,-2.54) 2(30.48,0) 3(30.48,2.54) 4(27.94,-2.54) 5(27.94,0) 6(27.94,2.54) 7(25.4,-2.54) 8(25.4,0) 9(25.4,2.54) 10(22.86,-2.54) 11(22.86,0) 12(22.86,2.54) 13(20.32,-2.54) 14(20.32,0) 15(20.32,2.54) 16(17.78,-2.54) 17(17.78,0) 18(17.78,2.54) 19(15.24,-2.54) 20(15.24,0) 21(15.24,2.54) 22(12.7,-2.54) 23(12.7,0) 24(12.7,2.54) 25(10.16,-2.54) 26(10.16,0) 27(10.16,2.54) 28(7.62,-2.54) 29(7.62,0) 30(7.62,2.54) 31(5.08,-2.54) 32(5.08,0) 33(5.08,2.54) 34(2.54,-2.54) 35(2.54,0) 36(2.54,2.54) 37(0,-2.54) 38(0,0) 39(0,2.54) 40(-2.54,-2.54) 41(-2.54,0) 42(-2.54,2.54) 43(-5.08,-2.54) 44(-5.08,0) 45(-5.08,2.54) 46(-7.62,-2.54) 47(-7.62,0) 48(-7.62,2.54) 49(-10.16,-2.54) 50(-10.16,0) 51(-10.16,2.54) 52(-12.7,-2.54) 53(-12.7,0) 54(-12.7,2.54) 55(-15.24,-2.54) 56(-15.24,0) 57(-15.24,2.54) 58(-17.78,-2.54) 59(-17.78,0) 60(-17.78,2.54) 61(-20.32,-2.54) 62(-20.32,0) 63(-20.32,2.54) 64(-22.86,-2.54) 65(-22.86,0) 66(-22.86,2.54) 67(-25.4,-2.54) 68(-25.4,0) 69(-25.4,2.54) 70(-27.94,-2.54) 71(-27.94,0) 72(-27.94,2.54) 73(-30.48,-2.54) 74(-30.48,0) 75(-30.48,2.54)
Top Overlay:
  lines w0.203: -31.879,-3.695 31.879,-3.695 31.879,3.695 -31.879,3.695 -31.879,-3.695
  text "1" at 30.172,-5.188 h0.94
  text "3" at 30.168,3.989 h0.94
Mechanical 16:
  rectangle: -30.83,-2.89 -30.13,-2.19
  rectangle: -30.83,-0.35 -30.13,0.35
  rectangle: -30.83,2.19 -30.13,2.89
  rectangle: -28.29,-2.89 -27.59,-2.19
  rectangle: -28.29,-0.35 -27.59,0.35
  rectangle: -28.29,2.19 -27.59,2.89
  rectangle: -25.75,-2.89 -25.05,-2.19
  rectangle: -25.75,-0.35 -25.05,0.35
  rectangle: -25.75,2.19 -25.05,2.89
  rectangle: -23.21,-2.89 -22.51,-2.19
  rectangle: -23.21,-0.35 -22.51,0.35
  rectangle: -23.21,2.19 -22.51,2.89
  rectangle: -20.67,-2.89 -19.97,-2.19
  rectangle: -20.67,-0.35 -19.97,0.35
  rectangle: -20.67,2.19 -19.97,2.89
  rectangle: -18.13,-2.89 -17.43,-2.19
  rectangle: -18.13,-0.35 -17.43,0.35
  rectangle: -18.13,2.19 -17.43,2.89
  rectangle: -15.59,-2.89 -14.89,-2.19
  rectangle: -15.59,-0.35 -14.89,0.35
  rectangle: -15.59,2.19 -14.89,2.89
  rectangle: -13.05,-2.89 -12.35,-2.19
  rectangle: -13.05,-0.35 -12.35,0.35
  rectangle: -13.05,2.19 -12.35,2.89
  rectangle: -10.51,-2.89 -9.81,-2.19
  rectangle: -10.51,-0.35 -9.81,0.35
  rectangle: -10.51,2.19 -9.81,2.89
  rectangle: -7.97,-2.89 -7.27,-2.19
  rectangle: -7.97,-0.35 -7.27,0.35
  rectangle: -7.97,2.19 -7.27,2.89
  rectangle: -5.43,-2.89 -4.73,-2.19
  rectangle: -5.43,-0.35 -4.73,0.35
  rectangle: -5.43,2.19 -4.73,2.89
  rectangle: -2.89,-2.89 -2.19,-2.19
  rectangle: -2.89,-0.35 -2.19,0.35
  rectangle: -2.89,2.19 -2.19,2.89
  rectangle: -0.35,-2.89 0.35,-2.19
  rectangle: -0.35,-0.35 0.35,0.35
  rectangle: -0.35,2.19 0.35,2.89
  rectangle: 2.19,-2.89 2.89,-2.19
  rectangle: 2.19,-0.35 2.89,0.35
  rectangle: 2.19,2.19 2.89,2.89
  rectangle: 4.73,-2.89 5.43,-2.19
  rectangle: 4.73,-0.35 5.43,0.35
  rectangle: 4.73,2.19 5.43,2.89
  rectangle: 7.27,-2.89 7.97,-2.19
  rectangle: 7.27,-0.35 7.97,0.35
  rectangle: 7.27,2.19 7.97,2.89
  rectangle: 9.81,-2.89 10.51,-2.19
  rectangle: 9.81,-0.35 10.51,0.35
  rectangle: 9.81,2.19 10.51,2.89
  rectangle: 12.35,-2.89 13.05,-2.19
  rectangle: 12.35,-0.35 13.05,0.35
  rectangle: 12.35,2.19 13.05,2.89
  rectangle: 14.89,-2.89 15.59,-2.19
  rectangle: 14.89,-0.35 15.59,0.35
  rectangle: 14.89,2.19 15.59,2.89
  rectangle: 17.43,-2.89 18.13,-2.19
  rectangle: 17.43,-0.35 18.13,0.35
  rectangle: 17.43,2.19 18.13,2.89
  rectangle: 19.97,-2.89 20.67,-2.19
  rectangle: 19.97,-0.35 20.67,0.35
  rectangle: 19.97,2.19 20.67,2.89
  rectangle: 22.51,-2.89 23.21,-2.19
  rectangle: 22.51,-0.35 23.21,0.35
  rectangle: 22.51,2.19 23.21,2.89
  rectangle: 25.05,-2.89 25.75,-2.19
  rectangle: 25.05,-0.35 25.75,0.35
  rectangle: 25.05,2.19 25.75,2.89
  rectangle: 27.59,-2.89 28.29,-2.19
  rectangle: 27.59,-0.35 28.29,0.35
  rectangle: 27.59,2.19 28.29,2.89
  rectangle: 30.13,-2.89 30.83,-2.19
  rectangle: 30.13,-0.35 30.83,0.35
  rectangle: 30.13,2.19 30.83,2.89

## TSW-125-02-S-T-RA [mil]
pads (75):
  oct 59.06x59.06 hole 39.37: 1(1200,60) 2(1200,160) 3(1200,260) 4(1100,60) 5(1100,160) 6(1100,260) 7(1000,60) 8(1000,160) 9(1000,260) 10(900,60) 11(900,160) 12(900,260) 13(800,60) 14(800,160) 15(800,260) 16(700,60) 17(700,160) 18(700,260) 19(600,60) 20(600,160) 21(600,260) 22(500,60) 23(500,160) 24(500,260) 25(400,60) 26(400,160) 27(400,260) 28(300,60) 29(300,160) 30(300,260) 31(200,60) 32(200,160) 33(200,260) 34(100,60) 35(100,160) 36(100,260) 37(0,60) 38(0,160) 39(0,260) 40(-100,60) 41(-100,160) 42(-100,260) 43(-200,60) 44(-200,160) 45(-200,260) 46(-300,60) 47(-300,160) 48(-300,260) 49(-400,60) 50(-400,160) 51(-400,260) 52(-500,60) 53(-500,160) 54(-500,260) 55(-600,60) 56(-600,160) 57(-600,260) 58(-700,60) 59(-700,160) 60(-700,260) 61(-800,60) 62(-800,160) 63(-800,260) 64(-900,60) 65(-900,160) 66(-900,260) 67(-1000,60) 68(-1000,160) 69(-1000,260) 70(-1100,60) 71(-1100,160) 72(-1100,260) 73(-1200,60) 74(-1200,160) 75(-1200,260)
Top Overlay:
  rectangle: -1210,-310.63 -1190,-80.32
  rectangle: -1110,-310.63 -1090,-80.32
  rectangle: -1010,-310.63 -990,-80.32
  rectangle: -910,-310.63 -890,-80.32
  rectangle: -810,-310.63 -790,-80.32
  rectangle: -710,-310.63 -690,-80.32
  rectangle: -610,-310.63 -590,-80.32
  rectangle: -510,-310.63 -490,-80.32
  rectangle: -410,-310.63 -390,-80.32
  rectangle: -310,-310.63 -290,-80.32
  rectangle: -210,-310.63 -190,-80.32
  rectangle: -110,-310.63 -90,-80.32
  rectangle: -10,-310.63 10,-80.32
  rectangle: 90,-310.63 110,-80.32
  rectangle: 190,-310.63 210,-80.32
  rectangle: 290,-310.63 310,-80.32
  rectangle: 390,-310.63 410,-80.32
  rectangle: 490,-310.63 510,-80.32
  rectangle: 590,-310.63 610,-80.32
  rectangle: 690,-310.63 710,-80.32
  rectangle: 790,-310.63 810,-80.32
  rectangle: 890,-310.63 910,-80.32
  rectangle: 990,-310.63 1010,-80.32
  rectangle: 1090,-310.63 1110,-80.32
  rectangle: 1190,-310.63 1210,-80.32
  lines w8: -1255.08,-80.55 1255.08,-80.55 1255.08,-4.17 -1255.08,-4.17 -1255.08,-80.55
  text "1" at 1251.57,41.34 h36.81
  text "3" at 1252.17,236.81 h36.81
Mechanical 16:
  rectangle: -1210,0 -1190,270
  rectangle: -1110,0 -1090,270
  rectangle: -1010,0 -990,270
  rectangle: -910,0 -890,270
  rectangle: -810,0 -790,270
  rectangle: -710,0 -690,270
  rectangle: -610,0 -590,270
  rectangle: -510,0 -490,270
  rectangle: -410,0 -390,270
  rectangle: -310,0 -290,270
  rectangle: -210,0 -190,270
  rectangle: -110,0 -90,270
  rectangle: -10,0 10,270
  rectangle: 90,0 110,270
  rectangle: 190,0 210,270
  rectangle: 290,0 310,270
  rectangle: 390,0 410,270
  rectangle: 490,0 510,270
  rectangle: 590,0 610,270
  rectangle: 690,0 710,270
  rectangle: 790,0 810,270
  rectangle: 890,0 910,270
  rectangle: 990,0 1010,270
  rectangle: 1090,0 1110,270
  rectangle: 1190,0 1210,270

## TSW-126-02-S-D [mm]
pads (52):
  oct 1.5x1.5 hole 1: 1(31.75,-1.27) 2(31.75,1.27) 3(29.21,-1.27) 4(29.21,1.27) 5(26.67,-1.27) 6(26.67,1.27) 7(24.13,-1.27) 8(24.13,1.27) 9(21.59,-1.27) 10(21.59,1.27) 11(19.05,-1.27) 12(19.05,1.27) 13(16.51,-1.27) 14(16.51,1.27) 15(13.97,-1.27) 16(13.97,1.27) 17(11.43,-1.27) 18(11.43,1.27) 19(8.89,-1.27) 20(8.89,1.27) 21(6.35,-1.27) 22(6.35,1.27) 23(3.81,-1.27) 24(3.81,1.27) 25(1.27,-1.27) 26(1.27,1.27) 27(-1.27,-1.27) 28(-1.27,1.27) 29(-3.81,-1.27) 30(-3.81,1.27) 31(-6.35,-1.27) 32(-6.35,1.27) 33(-8.89,-1.27) 34(-8.89,1.27) 35(-11.43,-1.27) 36(-11.43,1.27) 37(-13.97,-1.27) 38(-13.97,1.27) 39(-16.51,-1.27) 40(-16.51,1.27) 41(-19.05,-1.27) 42(-19.05,1.27) 43(-21.59,-1.27) 44(-21.59,1.27) 45(-24.13,-1.27) 46(-24.13,1.27) 47(-26.67,-1.27) 48(-26.67,1.27) 49(-29.21,-1.27) 50(-29.21,1.27) 51(-31.75,-1.27) 52(-31.75,1.27)
Top Overlay:
  lines w0.203: -33.149,-2.425 33.149,-2.425 33.149,2.425 -33.149,2.425 -33.149,-2.425
  text "1" at 31.542,-3.818 h0.94
  text "2" at 31.367,2.744 h0.94
Mechanical 16:
  rectangle: -32.1,-1.62 -31.4,-0.92
  rectangle: -32.1,0.92 -31.4,1.62
  rectangle: -29.56,-1.62 -28.86,-0.92
  rectangle: -29.56,0.92 -28.86,1.62
  rectangle: -27.02,-1.62 -26.32,-0.92
  rectangle: -27.02,0.92 -26.32,1.62
  rectangle: -24.48,-1.62 -23.78,-0.92
  rectangle: -24.48,0.92 -23.78,1.62
  rectangle: -21.94,-1.62 -21.24,-0.92
  rectangle: -21.94,0.92 -21.24,1.62
  rectangle: -19.4,-1.62 -18.7,-0.92
  rectangle: -19.4,0.92 -18.7,1.62
  rectangle: -16.86,-1.62 -16.16,-0.92
  rectangle: -16.86,0.92 -16.16,1.62
  rectangle: -14.32,-1.62 -13.62,-0.92
  rectangle: -14.32,0.92 -13.62,1.62
  rectangle: -11.78,-1.62 -11.08,-0.92
  rectangle: -11.78,0.92 -11.08,1.62
  rectangle: -9.24,-1.62 -8.54,-0.92
  rectangle: -9.24,0.92 -8.54,1.62
  rectangle: -6.7,-1.62 -6,-0.92
  rectangle: -6.7,0.92 -6,1.62
  rectangle: -4.16,-1.62 -3.46,-0.92
  rectangle: -4.16,0.92 -3.46,1.62
  rectangle: -1.62,-1.62 -0.92,-0.92
  rectangle: -1.62,0.92 -0.92,1.62
  rectangle: 0.92,-1.62 1.62,-0.92
  rectangle: 0.92,0.92 1.62,1.62
  rectangle: 3.46,-1.62 4.16,-0.92
  rectangle: 3.46,0.92 4.16,1.62
  rectangle: 6,-1.62 6.7,-0.92
  rectangle: 6,0.92 6.7,1.62
  rectangle: 8.54,-1.62 9.24,-0.92
  rectangle: 8.54,0.92 9.24,1.62
  rectangle: 11.08,-1.62 11.78,-0.92
  rectangle: 11.08,0.92 11.78,1.62
  rectangle: 13.62,-1.62 14.32,-0.92
  rectangle: 13.62,0.92 14.32,1.62
  rectangle: 16.16,-1.62 16.86,-0.92
  rectangle: 16.16,0.92 16.86,1.62
  rectangle: 18.7,-1.62 19.4,-0.92
  rectangle: 18.7,0.92 19.4,1.62
  rectangle: 21.24,-1.62 21.94,-0.92
  rectangle: 21.24,0.92 21.94,1.62
  rectangle: 23.78,-1.62 24.48,-0.92
  rectangle: 23.78,0.92 24.48,1.62
  rectangle: 26.32,-1.62 27.02,-0.92
  rectangle: 26.32,0.92 27.02,1.62
  rectangle: 28.86,-1.62 29.56,-0.92
  rectangle: 28.86,0.92 29.56,1.62
  rectangle: 31.4,-1.62 32.1,-0.92
  rectangle: 31.4,0.92 32.1,1.62

## TSW-126-02-S-D-RA [mil]
pads (52):
  oct 59.06x59.06 hole 39.37: 1(1250,60) 2(1250,160) 3(1150,60) 4(1150,160) 5(1050,60) 6(1050,160) 7(950,60) 8(950,160) 9(850,60) 10(850,160) 11(750,60) 12(750,160) 13(650,60) 14(650,160) 15(550,60) 16(550,160) 17(450,60) 18(450,160) 19(350,60) 20(350,160) 21(250,60) 22(250,160) 23(150,60) 24(150,160) 25(50,60) 26(50,160) 27(-50,60) 28(-50,160) 29(-150,60) 30(-150,160) 31(-250,60) 32(-250,160) 33(-350,60) 34(-350,160) 35(-450,60) 36(-450,160) 37(-550,60) 38(-550,160) 39(-650,60) 40(-650,160) 41(-750,60) 42(-750,160) 43(-850,60) 44(-850,160) 45(-950,60) 46(-950,160) 47(-1050,60) 48(-1050,160) 49(-1150,60) 50(-1150,160) 51(-1250,60) 52(-1250,160)
Top Overlay:
  rectangle: -1260,-310.63 -1240,-80.32
  rectangle: -1160,-310.63 -1140,-80.32
  rectangle: -1060,-310.63 -1040,-80.32
  rectangle: -960,-310.63 -940,-80.32
  rectangle: -860,-310.63 -840,-80.32
  rectangle: -760,-310.63 -740,-80.32
  rectangle: -660,-310.63 -640,-80.32
  rectangle: -560,-310.63 -540,-80.32
  rectangle: -460,-310.63 -440,-80.32
  rectangle: -360,-310.63 -340,-80.32
  rectangle: -260,-310.63 -240,-80.32
  rectangle: -160,-310.63 -140,-80.32
  rectangle: -60,-310.63 -40,-80.32
  rectangle: 40,-310.63 60,-80.32
  rectangle: 140,-310.63 160,-80.32
  rectangle: 240,-310.63 260,-80.32
  rectangle: 340,-310.63 360,-80.32
  rectangle: 440,-310.63 460,-80.32
  rectangle: 540,-310.63 560,-80.32
  rectangle: 640,-310.63 660,-80.32
  rectangle: 740,-310.63 760,-80.32
  rectangle: 840,-310.63 860,-80.32
  rectangle: 940,-310.63 960,-80.32
  rectangle: 1040,-310.63 1060,-80.32
  rectangle: 1140,-310.63 1160,-80.32
  rectangle: 1240,-310.63 1260,-80.32
  lines w8: -1305.08,-80.55 1305.08,-80.55 1305.08,-4.17 -1305.08,-4.17 -1305.08,-80.55
  text "1" at 1300.59,30.51 h36.81
  text "2" at 1299.21,129.53 h36.81
Mechanical 16:
  rectangle: -1260,0 -1240,170
  rectangle: -1160,0 -1140,170
  rectangle: -1060,0 -1040,170
  rectangle: -960,0 -940,170
  rectangle: -860,0 -840,170
  rectangle: -760,0 -740,170
  rectangle: -660,0 -640,170
  rectangle: -560,0 -540,170
  rectangle: -460,0 -440,170
  rectangle: -360,0 -340,170
  rectangle: -260,0 -240,170
  rectangle: -160,0 -140,170
  rectangle: -60,0 -40,170
  rectangle: 40,0 60,170
  rectangle: 140,0 160,170
  rectangle: 240,0 260,170
  rectangle: 340,0 360,170
  rectangle: 440,0 460,170
  rectangle: 540,0 560,170
  rectangle: 640,0 660,170
  rectangle: 740,0 760,170
  rectangle: 840,0 860,170
  rectangle: 940,0 960,170
  rectangle: 1040,0 1060,170
  rectangle: 1140,0 1160,170
  rectangle: 1240,0 1260,170

## TSW-126-02-S-Q [mm]
pads (52):
  oct 1.5x1.5 hole 1: 1(31.75,-2.54) 2(31.75,2.54) 3(29.21,-2.54) 4(29.21,2.54) 5(26.67,-2.54) 6(26.67,2.54) 7(24.13,-2.54) 8(24.13,2.54) 9(21.59,-2.54) 10(21.59,2.54) 11(19.05,-2.54) 12(19.05,2.54) 13(16.51,-2.54) 14(16.51,2.54) 15(13.97,-2.54) 16(13.97,2.54) 17(11.43,-2.54) 18(11.43,2.54) 19(8.89,-2.54) 20(8.89,2.54) 21(6.35,-2.54) 22(6.35,2.54) 23(3.81,-2.54) 24(3.81,2.54) 25(1.27,-2.54) 26(1.27,2.54) 27(-1.27,-2.54) 28(-1.27,2.54) 29(-3.81,-2.54) 30(-3.81,2.54) 31(-6.35,-2.54) 32(-6.35,2.54) 33(-8.89,-2.54) 34(-8.89,2.54) 35(-11.43,-2.54) 36(-11.43,2.54) 37(-13.97,-2.54) 38(-13.97,2.54) 39(-16.51,-2.54) 40(-16.51,2.54) 41(-19.05,-2.54) 42(-19.05,2.54) 43(-21.59,-2.54) 44(-21.59,2.54) 45(-24.13,-2.54) 46(-24.13,2.54) 47(-26.67,-2.54) 48(-26.67,2.54) 49(-29.21,-2.54) 50(-29.21,2.54) 51(-31.75,-2.54) 52(-31.75,2.54)
Top Overlay:
  lines w0.203: -33.149,-3.695 33.149,-3.695 33.149,3.695 -33.149,3.695 -33.149,-3.695
  text "1" at 31.592,-5.138 h0.94
  text "2" at 31.492,3.989 h0.94
Mechanical 16:
  rectangle: -32.1,-2.89 -31.4,-2.19
  rectangle: -32.1,2.19 -31.4,2.89
  rectangle: -29.56,-2.89 -28.86,-2.19
  rectangle: -29.56,2.19 -28.86,2.89
  rectangle: -27.02,-2.89 -26.32,-2.19
  rectangle: -27.02,2.19 -26.32,2.89
  rectangle: -24.48,-2.89 -23.78,-2.19
  rectangle: -24.48,2.19 -23.78,2.89
  rectangle: -21.94,-2.89 -21.24,-2.19
  rectangle: -21.94,2.19 -21.24,2.89
  rectangle: -19.4,-2.89 -18.7,-2.19
  rectangle: -19.4,2.19 -18.7,2.89
  rectangle: -16.86,-2.89 -16.16,-2.19
  rectangle: -16.86,2.19 -16.16,2.89
  rectangle: -14.32,-2.89 -13.62,-2.19
  rectangle: -14.32,2.19 -13.62,2.89
  rectangle: -11.78,-2.89 -11.08,-2.19
  rectangle: -11.78,2.19 -11.08,2.89
  rectangle: -9.24,-2.89 -8.54,-2.19
  rectangle: -9.24,2.19 -8.54,2.89
  rectangle: -6.7,-2.89 -6,-2.19
  rectangle: -6.7,2.19 -6,2.89
  rectangle: -4.16,-2.89 -3.46,-2.19
  rectangle: -4.16,2.19 -3.46,2.89
  rectangle: -1.62,-2.89 -0.92,-2.19
  rectangle: -1.62,2.19 -0.92,2.89
  rectangle: 0.92,-2.89 1.62,-2.19
  rectangle: 0.92,2.19 1.62,2.89
  rectangle: 3.46,-2.89 4.16,-2.19
  rectangle: 3.46,2.19 4.16,2.89
  rectangle: 6,-2.89 6.7,-2.19
  rectangle: 6,2.19 6.7,2.89
  rectangle: 8.54,-2.89 9.24,-2.19
  rectangle: 8.54,2.19 9.24,2.89
  rectangle: 11.08,-2.89 11.78,-2.19
  rectangle: 11.08,2.19 11.78,2.89
  rectangle: 13.62,-2.89 14.32,-2.19
  rectangle: 13.62,2.19 14.32,2.89
  rectangle: 16.16,-2.89 16.86,-2.19
  rectangle: 16.16,2.19 16.86,2.89
  rectangle: 18.7,-2.89 19.4,-2.19
  rectangle: 18.7,2.19 19.4,2.89
  rectangle: 21.24,-2.89 21.94,-2.19
  rectangle: 21.24,2.19 21.94,2.89
  rectangle: 23.78,-2.89 24.48,-2.19
  rectangle: 23.78,2.19 24.48,2.89
  rectangle: 26.32,-2.89 27.02,-2.19
  rectangle: 26.32,2.19 27.02,2.89
  rectangle: 28.86,-2.89 29.56,-2.19
  rectangle: 28.86,2.19 29.56,2.89
  rectangle: 31.4,-2.89 32.1,-2.19
  rectangle: 31.4,2.19 32.1,2.89